# Altium footprint library Tienanh.PcbLib: 190 footprints (part 8 of 12)
Each footprint in its own frame and in the unit in brackets; x right, y up, seen from the top. Pads: shape width x height; smd on the part's side, far side on the other; paste and mask are expansions set on the pad; w line width, h text height; cw(c..) or ccw(c..) is an arc to the next point about the centre after c.
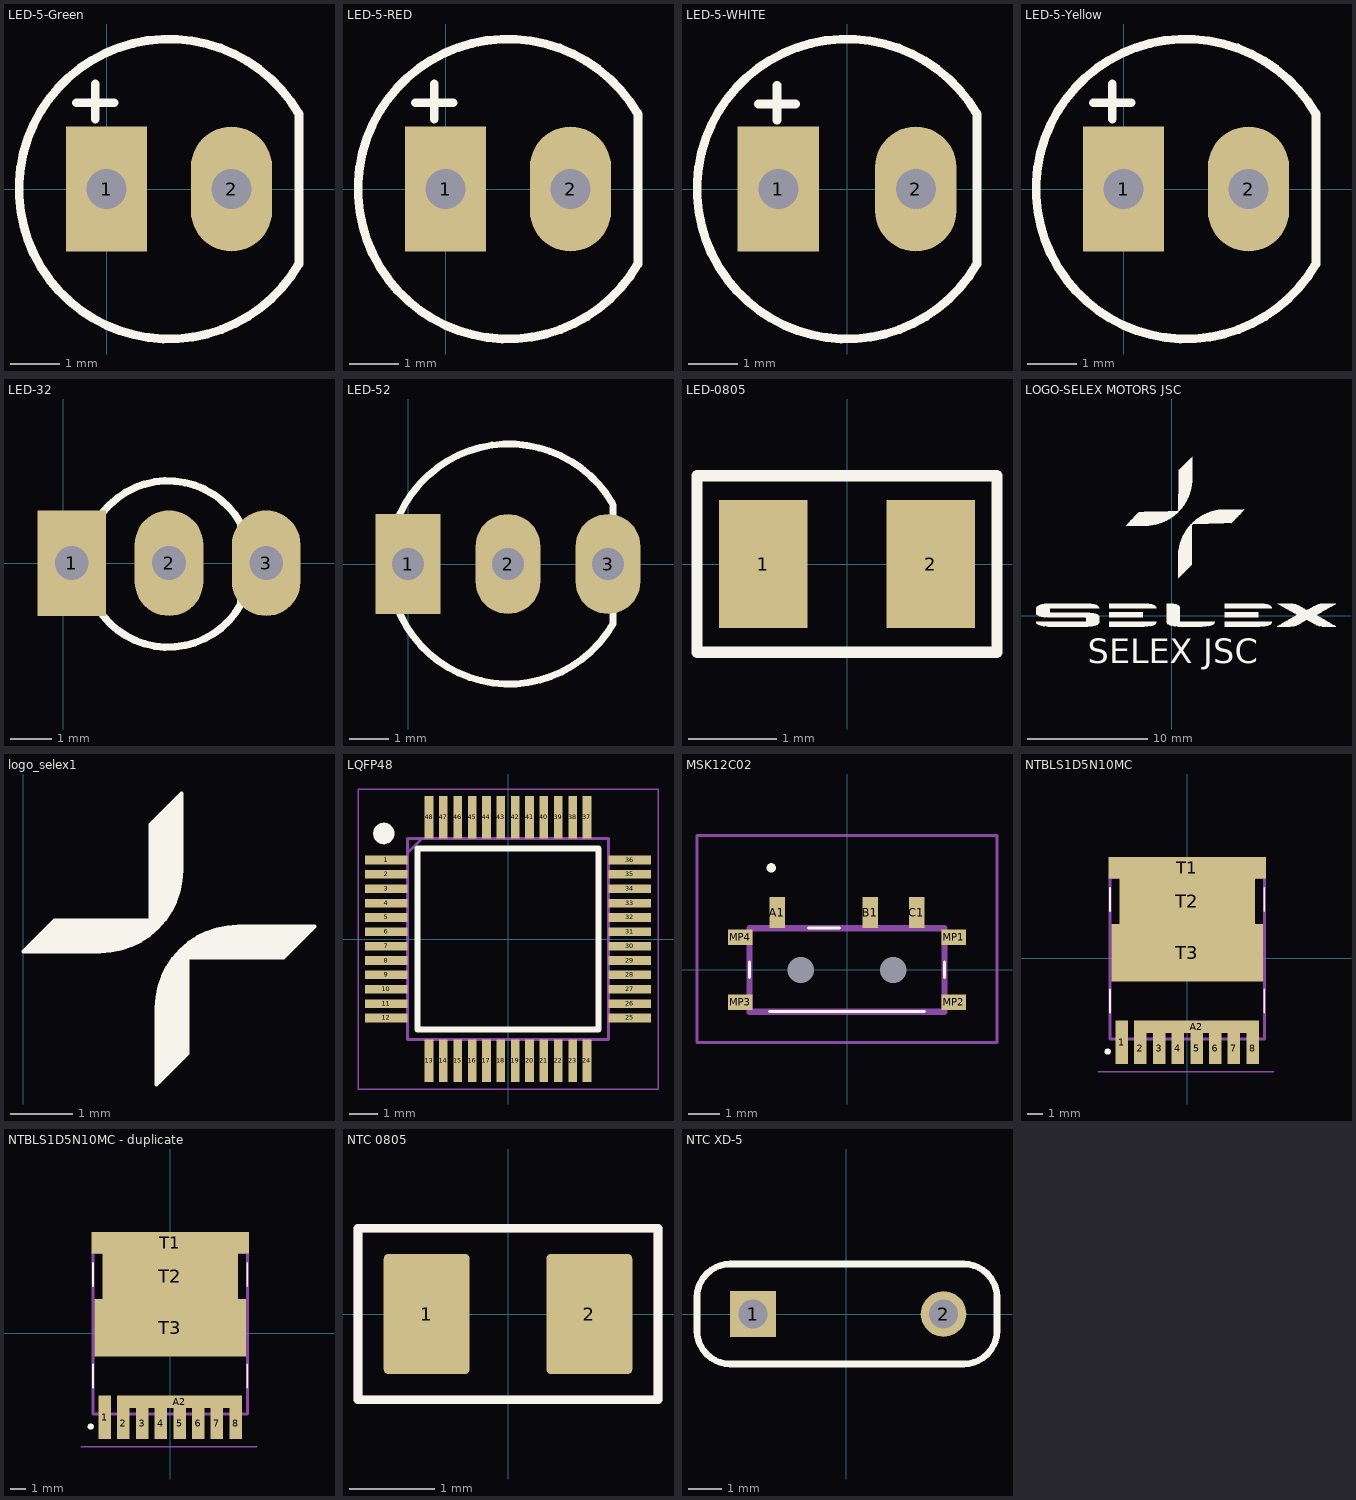
[diagram p7: the footprints below, top view; thin cyan lines are the x and y axes]

## LED-5-Green [mil] "LED 2 PIN, 5 ly , Only colour,pin to pin 100mil"
height 300
pads (2):
  rect 65x100 hole 32: 1(0,0)
  oval 65x100 hole 32: 2(100,0)
Top Overlay:
  lines w7: -24,69 6,69 ; -9,56 -9,84 ; 153.51,60.71 ccw(c50,0) 153.94,-59.97 ; 154,-59 154,60
3D body "SW3dPS-LEDd5G.STEP": height 339.18, standoff -243.49, extent -68.69,-119.99 144.69,117

## LED-5-RED [mil] "LED 2 PIN, 5 ly , Only colour,pin to pin 100mil"
height 300
pads (2):
  rect 65x100 hole 32: 1(0,0)
  oval 65x100 hole 32: 2(100,0)
Top Overlay:
  lines w7: -24,69 6,69 ; -9,56 -9,84 ; 153.51,60.71 ccw(c50,0) 153.94,-59.97 ; 154,-59 154,60
3D body "SW3dPS-LEDd5R.STEP": height 339.18, standoff -243.49, extent -64.69,-119 148.69,117.99

## LED-5-WHITE [mil] "LED 2 PIN, 5 ly , Only colour, pin to pin 110mil"
height 300
pads (2):
  rect 65x100 hole 32: 1(-55,0)
  oval 65x100 hole 32: 2(55,0)
Top Overlay:
  lines w7: -71,68 -41,68 ; -56,55 -56,83 ; 103.51,60.71 ccw(c0,0) 103.94,-59.97 ; 104,-59 104,60
3D body "5 mm yellow led.step": height 340.05, standoff -767.12, extent -124,-125 120.88,120.26

## LED-5-Yellow [mil] "LED 2 PIN, 5 ly , Only colour,pin to pin 100mil"
height 300
pads (2):
  rect 65x100 hole 32: 1(0,0)
  oval 65x100 hole 32: 2(100,0)
Top Overlay:
  lines w7: -24,69 6,69 ; -9,56 -9,84 ; 153.51,60.71 ccw(c50,0) 153.94,-59.97 ; 154,-59 154,60
3D body "SW3dPS-LEDd5O.STEP": height 339.18, standoff -243.49, extent -66.69,-121.99 146.69,115

## LED-32 [mil] "LED 3 PIN, 3ly Two colour"
height 300
pads (3):
  rect 65x100 hole 32: 1(8,0)
  oval 65x100 hole 32: 2(100,0) 3(192,0)
Top Overlay:
  lines w7: 168,-39 168,37
  lines w7.01: 167.87,37.48 ccw(c99.08,-0.84) 167.97,-38.98
3D body "User Library-LED RG.step": height 293.12, standoff -235.62, extent 16.42,-85 193.58,72.48

## LED-52 [mil] "LED 3 PIN, 5 ly , Two colour"
height 300
pads (3):
  rect 65x100 hole 32: 1(0,0)
  oval 65x100 hole 32: 2(100,0) 3(200,0)
Top Overlay:
  lines w7: 204.51,60.71 ccw(c101,0) 204.94,-59.97 ; 205,-59 205,59
3D body "User Library-5mmBiColorLED.step": height 426.6, standoff -102.4, extent -16,-115.98 210,115.98

## LED-0805 [mm]
pads (2):
  rect 1x1.45 smd: 1(-0.95,0) 2(0.95,0)
Top Overlay:
  lines w0.127: -1.7,-1 1.7,-1 1.7,1 -1.7,1 -1.7,-1
3D body "User Library-led_0805LED0805_Yellow.STEP": height 1.1, standoff 0, extent -1.01,-0.625 1.01,0.625

## LESR 50-NP [mm]
3D body "LESR_90.O8.XX.000.0_20170323.stp": height 21.04, standoff -3.26, extent -10.811,-2.974 11.105,10.726

## LOGO-SELEX MOTORS JSC [mm]
Top Overlay:
  drawing of 11 lines, arcs and shapes, not listed
  text "SELEX JSC" at -7.006,-4.59 h3.5

## logo_selex1 [mm]
Top Overlay:
  lines w0.051: 0.703,2.492 1.083,2.492 ; 0.729,2.492 -0.008,2.492 0.5,3 2.024,3 2.024,4.524 2.532,5.032 2.532,4.016 2.532,3.793 cw(c1.231,3.793) 2.151,2.873 cw(c1.231,3.793) 1.231,2.492 1.084,2.492 ; 3.573,2.898 3.426,2.898 ccw(c3.426,1.598) 2.507,2.517 ccw(c3.426,1.598) 2.126,1.598 2.126,1.374 2.126,0.358 2.634,0.866 2.634,2.39 4.158,2.39 4.666,2.898 3.929,2.898 ; 3.574,2.898 3.954,2.898
  lines w0.076: 0.068,2.543 1.516,2.543 ; 2.176,0.435 2.176,1.882 ; 2.481,3.508 2.481,4.956 ; 3.142,2.848 4.589,2.848
  lines w0.127: 0.17,2.594 1.592,2.594 ; 0.221,2.644 1.719,2.644 ; 0.271,2.695 1.846,2.695 ; 0.348,2.771 1.973,2.771 ; 0.424,2.848 2.049,2.848 ; 0.5,2.924 2.1,2.924 2.1,4.524 ; 2.176,2.975 2.176,4.6 ; 2.227,0.536 2.227,1.959 ; 2.253,3.051 2.253,4.676 ; 2.278,0.587 2.278,2.111 ; 2.329,0.638 2.329,2.213 ; 2.329,3.178 2.329,4.753 ; 2.38,3.279 2.38,4.803 ; 2.405,0.714 2.405,2.34 ; 2.43,3.432 2.43,4.854 ; 2.481,0.79 2.481,2.416 ; 2.557,0.866 2.557,2.467 4.158,2.467 ; 2.608,2.543 4.234,2.543 ; 2.684,2.619 4.31,2.619 ; 2.811,2.695 4.386,2.695 ; 2.938,2.746 4.437,2.746 ; 3.065,2.797 4.488,2.797

## LQFP48 [mm]
pads (48):
  rect 1.475x0.3 smd: 1(-4.238,2.75) 2(-4.238,2.25) 3(-4.238,1.75) 4(-4.238,1.25) 5(-4.238,0.75) 6(-4.238,0.25) 7(-4.238,-0.25) 8(-4.238,-0.75) 9(-4.238,-1.25) 10(-4.238,-1.75) 11(-4.238,-2.25) 12(-4.238,-2.75) 25(4.238,-2.75) 26(4.238,-2.25) 27(4.238,-1.75) 28(4.238,-1.25) 29(4.238,-0.75) 30(4.238,-0.25) 31(4.238,0.25) 32(4.238,0.75) 33(4.238,1.25) 34(4.238,1.75) 35(4.238,2.25) 36(4.238,2.75)
  rect 0.3x1.475 smd: 13(-2.75,-4.238) 14(-2.25,-4.238) 15(-1.75,-4.238) 16(-1.25,-4.238) 17(-0.75,-4.238) 18(-0.25,-4.238) 19(0.25,-4.238) 20(0.75,-4.238) 21(1.25,-4.238) 22(1.75,-4.238) 23(2.25,-4.238) 24(2.75,-4.238) 37(2.75,4.238) 38(2.25,4.238) 39(1.75,4.238) 40(1.25,4.238) 41(0.75,4.238) 42(0.25,4.238) 43(-0.25,4.238) 44(-0.75,4.238) 45(-1.25,4.238) 46(-1.75,4.238) 47(-2.25,4.238) 48(-2.75,4.238)
Top Overlay:
  circle w0.25: c-4.325,3.675 r0.25
  region: -4.425,3.425 -4.575,3.825 -4.225,3.875 -4.075,3.675
  lines w0.2: -3.15,-3.15 3.15,-3.15 3.15,3.15 -3.15,3.15 -3.15,-3.15
Mechanical 13:
  lines w0.1: -3.5,3 -3,3.5 ; -3.5,-3.5 3.5,-3.5 3.5,3.5 -3.5,3.5 -3.5,-3.5
Mechanical 15:
  lines w0.05: -5.225,-5.225 -5.225,5.225 5.225,5.225 5.225,-5.225 -5.225,-5.225
3D body "STM32G431C6T6.stp": height 0, standoff 0, extent 0,0 0,0

## MSK12C02 [mm]
pads (9):
  rect 0.5x1 smd: A1(-2.25,1.85) B1(0.75,1.85) C1(2.25,1.85)
  round 0.425 hole 0.85 unplated: MH1(-1.5,0) MH2(1.5,0)
  rect 0.8x0.5 smd: MP1(3.45,1.05) MP2(3.45,-1.05) MP3(-3.45,-1.05) MP4(-3.45,1.05)
Top Overlay:
  lines w0.1: -3.15,-0.25 -3.15,0.25 -3.15,-0.25 ; -2.5,-1.35 2.5,-1.35 -2.5,-1.35 ; -1.25,1.35 -0.25,1.35 -1.25,1.35 ; 3.15,-0.25 3.15,0.25 3.15,-0.25
  lines w0.2: -2.5,3.3 ccw(c-2.45,3.3) -2.4,3.3 ; -2.5,3.3 cw(c-2.45,3.3) -2.4,3.3 ; -2.5,3.3 ccw(c-2.45,3.3) -2.4,3.3
Mechanical 13:
  lines w0.2: -3.15,-1.35 -3.15,1.35 3.15,1.35 3.15,-1.35 -3.15,-1.35
Mechanical 15:
  lines w0.1: -4.85,-2.35 -4.85,4.35 4.85,4.35 4.85,-2.35 -4.85,-2.35
3D body "MSK12C02.stp": height 1.38, standoff -0.52, extent -3.85,-2.95 3.95,2.25

## NTBLS1D5N10MC [mm]
pads (12):
  rect 0.8x2.8 smd: 1(-4.2,-5.4)
  rect 0.8x2 smd: 2(-3,-5.8) 3(-1.8,-5.8) 4(-0.6,-5.8) 5(0.6,-5.8) 6(1.8,-5.8) 7(3,-5.8) 8(4.2,-5.8)
  rect 8x0.8 smd: A2(0.6,-4.4)
  rect 10.1x1.4 smd: T1(0,5.8)
  rect 8.7x2.9 smd: T2(0,3.65)
  rect 9.7x3.7 smd: T3(0,0.35)
Top Overlay:
  lines w0.1: -4.95,-3.5 -4.95,-2 ; -4.95,3 -4.95,4.5 ; 4.95,-3.5 4.95,-2 ; 4.95,3 4.95,4.5
  lines w0.2: -5.1,-6.1 cw(c-5.1,-6) -5.1,-5.9 cw(c-5.1,-6) -5.1,-6.1
Mechanical 13:
  lines w0.2: -4.95,-5.185 4.95,-5.185 4.95,5.185 -4.95,5.185 -4.95,-5.185
Mechanical 15:
  lines w0.1: -5.7,-7.3 5.55,-7.3
3D body "User Library-H-PSOF-8-1.STEP": height 2.3, standoff 0, extent -4.95,-5.202 4.95,6.473

## NTBLS1D5N10MC - duplicate [mm]
pads (12):
  rect 0.8x2.8 smd: 1(-4.2,-5.4)
  rect 0.8x2 smd: 2(-3,-5.8) 3(-1.8,-5.8) 4(-0.6,-5.8) 5(0.6,-5.8) 6(1.8,-5.8) 7(3,-5.8) 8(4.2,-5.8)
  rect 8x0.8 smd: A2(0.6,-4.4)
  rect 10.1x1.4 smd: T1(0,5.8)
  rect 8.7x2.9 smd: T2(0,3.65)
  rect 9.7x3.7 smd: T3(0,0.35)
Top Overlay:
  lines w0.1: -4.95,-3.5 -4.95,-2 ; -4.95,3 -4.95,4.5 ; 4.95,-3.5 4.95,-2 ; 4.95,3 4.95,4.5
  lines w0.2: -5.1,-6.1 ccw(c-5.1,-6) -5.1,-5.9 ccw(c-5.1,-6) -5.1,-6.1
Mechanical 13:
  lines w0.2: -4.95,-5.185 -4.95,5.185 4.95,5.185 4.95,-5.185 -4.95,-5.185
Mechanical 15:
  lines w0.1: -5.7,-7.3 5.55,-7.3
3D body "User Library-H-PSOF-8-1.STEP": height 2.3, standoff 0, extent -4.95,-5.202 4.95,6.473

## NTC 0805 [mm]
pads (2):
  rrect10% 1x1.4 smd mask+0.07: 1(-0.95,0) 2(0.95,0)
Top Overlay:
  lines w0.1: -1.75,-1 1.75,-1 1.75,1 -1.75,1 -1.75,-1
Top Assembly:
  lines w0.1: -1.75,-1 1.75,-1 1.75,1 -1.75,1 -1.75,-1
3D body "User Library-NTC 0805.STEP": height 0.61, standoff 0, extent -1.181,-0.51 1.181,0.51

## NTC XD-5 [mil]
pads (2):
  rect 54x54 hole 34: 1(-110,0)
  round 54 hole 34: 2(115,0)
Top Overlay:
  lines w7.87: -176.24,-19.68 ccw(c-136.87,-19.68) -136.87,-59.06 138.72,-59.06 ccw(c138.72,-19.68) 178.09,-19.69 178.09,19.68 ccw(c138.72,19.68) 138.72,59.06 -136.87,59.06 ccw(c-136.87,19.68) -176.24,19.69 -176.24,-19.68
3D body "User Library-NTC MF72 XD-7.STEP": height 472.44, standoff -157.48, extent -201.62,-169.4 203.66,178.24